# Altium schematic symbol library 724452_RPL-HX_Mobile_AEP_Rev0p91_Library.SchLib: 162 symbols (part 5 of 5) (continued)
## MEC152X_2
designator ?  (value not drawn)
Case/Package: *; Manufacturer Part Number: *
part A pins: A1 GPIO057_VCC_PWRGD_GPSPI_CLK_ALT, A2 XTAL1, A4 XTAL2, A7 GPIO062_RESETO_N_I2C11_SCL, A8 GPIO004_I2C00_SCL_UART2_DCD_N, A9 GPIO142_I2C05_SCL_UART2_CTS_N, A10 GPIO141_I2C05_SDA_UART2_RTS_N, B1 GPIO255_UART1_RX_ALT_UART1_DSR_N, B7 GPIO003_I2C00_SDA_UART2_RI_N, B8 GPIO143_I2C04_SDA_UART0_CTS_N, B9 GPIO150_I2C15_SCL_JTAG_TMS_UART2_DTR_N, B10 GPIO147_I2C15_SDA_JTAG_CLK_UART2_DSR_N, C1 VTR_PLL (power) hidden to VTR_PLL, C1 VTR_PLL, C7 GPIO144_I2C04_SCL_UART0_RTS_N, C8 GPIO146_I2C09_SCL_JTAG_TDO_UART2_TX, C12 GPIO060_KBRST_TST_CLK_OUT_UART1_DCD_N, D2 GPIO025_NEMI_INT_UART_CLK_UART1_RI_N, D12 GPIO155_I2C02_SCL_PS2_DAT1B, D13 GPIO154_I2C02_SDA_PS2_CLK1B, E1 GPIO035_PWM8_CTOUT1_ICT15, E3 NRESET_IN, E5 VBAT (power) hidden to VBAT, E5 VBAT, E8 GPIO145_I2C09_SDA_JTAG_TDI_UART2_RX, E12 GPIO007_I2C03_SDA_PS2_CLK0B, E13 GPIO010_I2C03_SCL_PS2_DAT0B, F1 GPIO244_UART_CLK_ALT_NEMI_INT_ALT_CMP_VIN1, F2 GPIO254_PWM1_ALT_CMP_VREF1, F5 VSS_ANALOG, F7 VTR1 (power) hidden to VTR1, F7 VTR1, F9 GPIO175_CMP_VOUT1_PWM8_ALT, F13 GPIO127_A20M_UART1_RTS_N, G1 VR_CAP (power) hidden to VR_CAP, G1 VR_CAP, G3 GPIO201_ADC01_TRACEDAT1, G5 VTR_REG (power) hidden to VTR_REG, G5 VTR_REG, G6 VSS2, G8 VSS1, H2 VREF_ADC (power) hidden to VREF_ADC, H2 VREF_ADC, H3 GPIO204_ADC04, H5 VSS_ADC, H6 VTR3 (power) hidden to VTR3, H6 VTR3, H7 VSS3, H8 VTR2 (power) hidden to VTR2, H8 VTR2, H12 GPIO105_UART0_RX_TFDP_DATA_TRACECLK, J1 GPIO200_ADC00_TRACEDAT0, J2 GPIO203_ADC03_TRACEDAT3, J3 GPIO061_ESPI_RESET_N_PWM7_ALT_NEC_SCI_ALT, J5 VTR_ANALOG (power) hidden to VTR_ANALOG, J5 VTR_ANALOG, J6 GPIO011_NSMI_ALT_PWM4_ICT7, J7 GPIO013_I2C07_SCL_SLV_SPI_IO3, J12 GPIO170_UART1_TX_CEC_OUT_JTAG_STRAP, J13 GPIO104_UART0_TX_TFDP_CLK_VTR2_STRAP, K1 GPIO202_ADC02_TRACEDAT2, K2 GPIO205_ADC05, K3 GPIO066_ESPI_CS_N_I2C13_SDA, K13 JTAG_RST_N, L2 GPIO206_ADC06, L3 GPIO065_ESPI_CLKI2C13_SCL_ICT5_ALT, L4 GPIO070_ESPI_IO0_I2C14_SDA, L5 GPIO073_ESPI_IO3_I2C01_SCL_ALT, L8 GPIO053_PWM0_SLV_SPI_MSTR_INT, M1 GPIO100_NEC_SCI_ALT2_ICT6, M2 GPIO207_ADC07_CMP_STRAP, M3 GPIO072_ESPI_IO2_I2C01_SDA_ALT, M4 GPIO063_ESPI_ALERT_N_PWM6_ALT_ICT8, M7 GPIO131_I2C01_SCL_SLV_SPI_CS_N, M8 GPIO014_PWM6_SLV_SPI_IO2_GPTP_IN2, M9 GPIO015_PWM7_ICT10, N2 GPIO012_I2C07_SDA_SLV_SPI_IO2, N3 GPIO071_ESPI_IO1_I2C14_SCL, N7 GPIO130_I2C01_SDA_SLV_SPI_IO0, N9 GPIO054_PWM1_SLV_SPI_SCLK
part B pins: A3 GPIO101_BGPO1, A5 GPIO024_GPSPI_CS_N_I2C07_SCL_ALT, A6 GPIO022_GPSPI_IO3, A11 GPIO241_PWM0_ALT_CMP_VOUT0, A12 GPIO153_LED2, A13 GPIO050_ICT0_TACH0, B2 GPIO221_32KHZ_OUT_SYS_SHDN_N, B3 GPIO102_BGPO2, B4 VCI_OVRD_IN_GPIO172, B5 GPIO253_BGPO0, B6 GPIO036, B11 GPIO171_UART1_RX_CEC_IN, B12 GPIO132_I2C06_SDA_KSO16, B13 GPIO157_LED1, C2 GPIO226, C3 SYSPWR_PRES_VCI_IN3_N_GPIO000_I2C11_SDA, C4 VCI_IN2_N_GPIO161, C5 VCI_IN1_N_GPIO162, C6 GPIO023_GPSPI_CLK, C9 GPIO245_GPSPI_IO0, C10 GPIO165_32KHZ_IN_CTOUT0, C11 GPIO243_GPSPI_IO1, C13 GPIO140_I2C06_SCL_ICT5_KSO17, D1 GPIO242_CMP_VIN0, D3 GPIO033_TACH3, D11 GPIO156_LED0, E2 GPIO246_CTOUT1_ALT_CMP_VREF0, E6 VCI_OUT_GPIO250, E7 GPIO240, E9 GPIO051_ICT1_TACH1, E11 GPIO125_PVT_CLK_KSO12, F3 GPIO106_PWROK, F6 VCI_IN0_N_GPIO163, F8 GPIO045_KSO01_PWM2_ALT_ICT14_CR_STRAP, F11 GPIO126_PVT_IO3_KSO13, F12 GPIO123_PVT_IO2_KSO10, G2 GPIO124_PVT_CS_N_KSO11_ICT12, G9 GPIO047_KSO03_PWM3_ALT_ICT13, G11 GPIO122_PVT_IO1_KSO09, G12 GPIO121_PVT_IO0_KSO08, G13 GPIO046_KSO02_ICT11, H1 GPIO067_VREF2_ADC, H9 GPIO043_SB-TSI_CLK, H11 GPIO044_VREF_VTT, H13 GPIO034_GPSPI_IO2, J8 GPIO222_PROCHOT_IN_N, J9 GPIO021_KSI2, J11 GPIO114_PS2_CLK0A_NEC_SCI, K11 GPIO107_NSMI_KSO04_I2C10_SCL, K12 GPIO042_PECI_DAT_SB-TSI_DAT, L1 GPIO152_KSO14_I2C07_SDA_ALT, L6 GPIO227_SHD_IO2_PWRGD_STRAP, L7 GPIO002_PWM5_SHD_CS1_N, L9 GPIO020_KSI1, L10 GPIO031_KSI6_GPTP_OUT1, L11 GPIO030_KSI5_I2C10_SDA, L12 GPIO112_KSO05, L13 GPIO115_PS2_DAT0A, M5 GPIO016_GPTP_IN1_SHD_IO3_ICT3_DSW_PWROK, M6 GPIO056_PWM3_SHD_CLK, M10 GPIO040_GPTP_OUT2_KSO00_UART1_CTS_N, M11 GPIO027_KSI4_UART0_DSR_N_I2C12_SCL, M12 GPIO120_KSO07_UART1_DTR_N, M13 GPIO113_KSO06_ICT9, N1 GPIO064_PCI_RESET_N, N4 GPIO224_GPTP_IN0_SHD_IO1, N5 GPIO223_SHD_IO0, N6 GPIO055_RSMRST_N_PWM2_SHD_CS0_N_BSS_STRAP, N8 GPIO052_ICT2_TACH2, N10 GPIO151_ICT4_KSO15, N11 GPIO017_KSI0_UART0_DCD_N, N12 GPIO032_KSI7_GPTP_OUT0_UART0_RI_N, N13 GPIO026_KSI3_UART0_DTR_N_I2C12_SDA
part A text: 1 OF 2
part B text: 2 OF 2

## MOSFET_N
designator ?, comment ?
CDS_LMAN_SYM_OUTLINE: -175,175,175,-175; OriginalSymbolOrigin: (-125,125); MATERIAL: ?; PACK_TYPE: ?; PART_NUMBER: ?
pins: 1 GATE (io), 2 SRC (io), 3 DRN (io)

## MOSFET_N#1
designator ?, comment ?
CDS_LMAN_SYM_OUTLINE: -100,100,100,-100; OriginalSymbolOrigin: (-75,75); MATERIAL: ?; PACK_TYPE: ?; PART_NUMBER: ?
pins: 1 GATE (io), 2 SRC (io), 3 DRN (io)

## MOSFET_N#2
designator ?, comment ?
CDS_LMAN_SYM_OUTLINE: -100,100,100,-100; OriginalSymbolOrigin: (-75,75); MATERIAL: ?; PACK_TYPE: ?; PART_NUMBER: ?
pins: 1 GATE (io), 2 SRC (io), 3 DRN (io)

## MOSFET_N_2
designator ?, comment ?
BOM_USE: STUFF; CDS_LMAN_SYM_OUTLINE: -200,200,200,-200; ROOM: NONE; OriginalSymbolOrigin: (-125,125); FP_TECH: ?; IP: ?; MATERIAL: ?; PACK_TYPE: ?; PART_NUMBER: ?; VARIANT: ?
pins: 1 GATE (io), 2 SRC (io), 3 DRN (io)

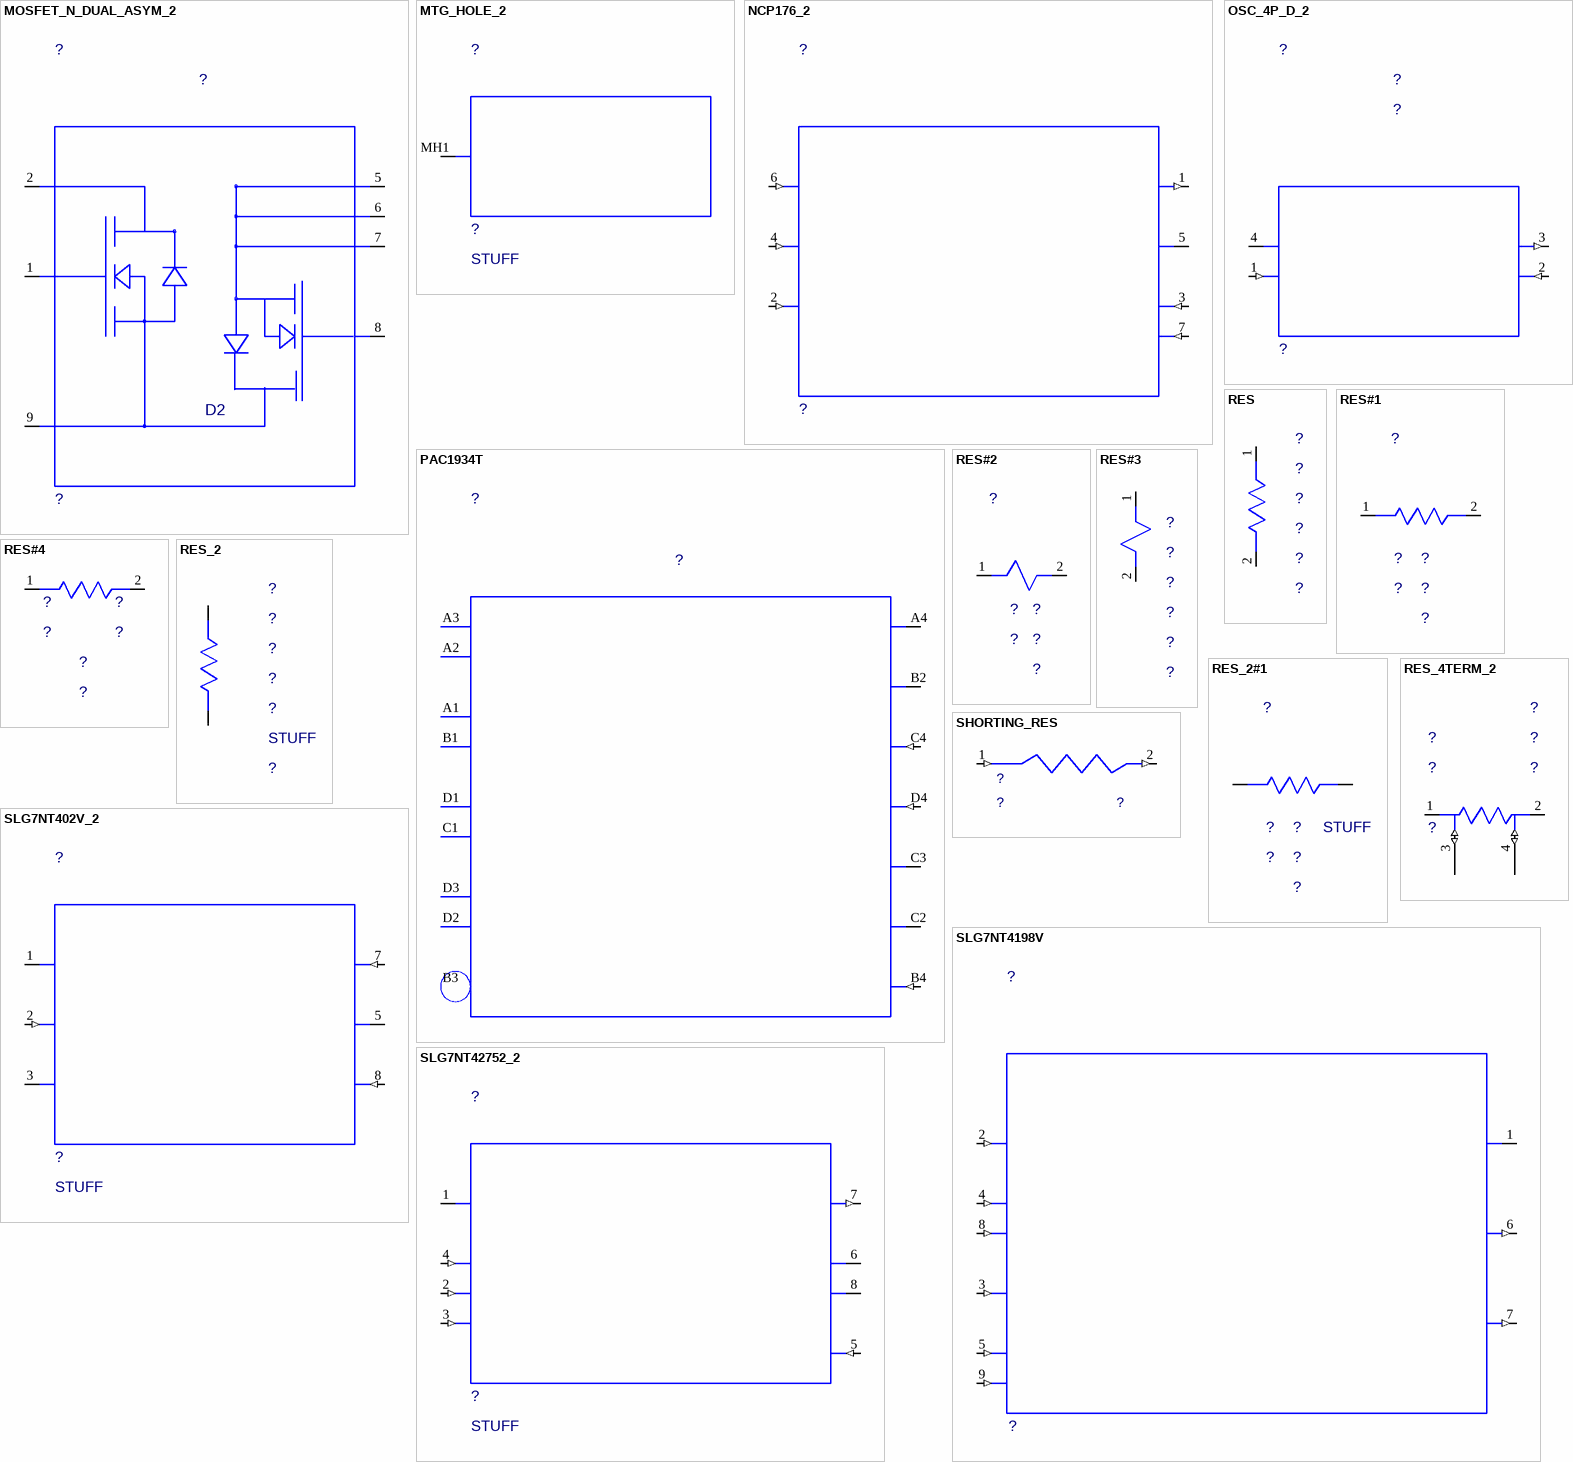
[diagram p41: symbols MOSFET_N_DUAL_ASYM_2 to SLG7NT42752_2]

## MOSFET_N_DUAL_ASYM_2
designator ?, comment ?
CDS_LMAN_SYM_OUTLINE: -250,300,250,-300; ROOM: NONE; OriginalSymbolOrigin: (-275,300); FP_TECH: ?; IP: ?; PACK_TYPE: ?; VARIANT: ?; MATERIAL: ?; PART_NUMBER: ?
pins: 1 G1 (io), 2 D1 (io), 5 S2_1 (io), 6 S2_2 (io), 7 S2_3 (io), 8 G2 (io), 9 S1_D2 (io)
text: D2

## MTG_HOLE_2
designator ?  BOM_USE: STUFF  (hidden comment: MTG_HOLE_2)
CDS_LMAN_SYM_OUTLINE: -200,100,200,-100; ROOM: NONE; OriginalSymbolOrigin: (-225,100); FP_TECH: ?; IP: ?; MATERIAL: ?; PACK_TYPE: ?; PART_NUMBER: ?; VARIANT: ?
pins: MH1 (io)

## NCP176_2
designator ?  (value not drawn)
CDS_LMAN_SYM_OUTLINE: -300,250,300,-200; ROOM: NONE; OriginalSymbolOrigin: (-325,250); FP_TECH: ?; IP: ?; MATERIAL: ?; PACK_TYPE: ?; PART_NUMBER: ?; VARIANT: ?
pins: 1 OUT (out), 2 FB (in), 3 GND (in), 4 EN (in), 5 NC (io), 6 IN (in), 7 GND_TPD (in)

## OSC_4P_D_2
designator ?, comment ?
BOM_USE: STUFF; CDS_LMAN_SYM_OUTLINE: -200,150,200,-100; ROOM: NONE; OriginalSymbolOrigin: (-225,150); FP_TECH: ?; IP: ?; MATERIAL: ?; PACK_TYPE: ?; PART_NUMBER: ?; TOLERANCE: ?; VARIANT: ?
pins: 1 E_D (in), 2 GND (in), 3 OUT (out), 4 VDD (power)

## PAC1934T
designator ?  (value not drawn)
CDS_LMAN_SYM_OUTLINE: -350,350,350,-350; OriginalSymbolOrigin: (-400,350); MATERIAL: ?; PACK_TYPE: ?; PART_NUMBER: ?
pins: A1 SENSE2_P (in), A2 SENSE1_N (in), A3 SENSE1_P (in), A4 VDD (power), B1 SENSE2_N (in), B2 VDD_IO (power), B3 PWRDN (in), B4 GND (in), C1 SENSE3_N (in), C2 ADDRSEL (io), C3 SLOW/ALERT_N (io), C4 SM_CLK (in), D1 SENSE3_P (in), D2 SENSE4_N (in), D3 SENSE4_P (in), D4 SM_DATA (in)

## RES
designator ?, comment ?
OriginalSymbolOrigin: (-25,75); MATERIAL: ?; PACK_TYPE: ?; PART_NUMBER: ?; TOLERANCE: ?; WATTAGE: ?
pins: 1 A (io), 2 B (io)

## RES#1
designator ?, comment ?
OriginalSymbolOrigin: (-75,25); MATERIAL: ?; PACK_TYPE: ?; PART_NUMBER: ?; TOLERANCE: ?; WATTAGE: ?
pins: 1 A (io), 2 B (io)

## RES#2
designator ?, comment ?
OriginalSymbolOrigin: (-75,50); MATERIAL: ?; PACK_TYPE: ?; PART_NUMBER: ?; TOLERANCE: ?; WATTAGE: ?
pins: 1 A (io), 2 B (io)

## RES#3
designator ?, comment ?
OriginalSymbolOrigin: (-25,75); MATERIAL: ?; PACK_TYPE: ?; PART_NUMBER: ?; TOLERANCE: ?; WATTAGE: ?
pins: 1 A (io), 2 B (io)

## RES#4
designator ?, comment ?
CDS_LMAN_SYM_OUTLINE: -50,25,50,-25; OriginalSymbolOrigin: (-75,25); FP_TECH: ?; IP: ?; MATERIAL: ?; PACK_TYPE: ?; PART_NUMBER: ?; TOLERANCE: ?; WATTAGE: ?
pins: 1 A (io), 2 B (io)

## RES_2
designator ?, comment ?  BOM_USE: STUFF
CDS_LMAN_SYM_OUTLINE: -50,50,50,-50; ROOM: NONE; OriginalSymbolOrigin: (-25,75); FP_TECH: ?; IP: ?; VARIANT: ?; MATERIAL: ?; PACK_TYPE: ?; PART_NUMBER: ?; TOLERANCE: ?; WATTAGE: ?
pins: 1 A (io), 2 B (io)

## RES_2#1
designator ?, comment ?  BOM_USE: STUFF
CDS_LMAN_SYM_OUTLINE: -50,50,50,-50; ROOM: NONE; OriginalSymbolOrigin: (-75,25); FP_TECH: ?; IP: ?; VARIANT: ?; MATERIAL: ?; PACK_TYPE: ?; PART_NUMBER: ?; TOLERANCE: ?; WATTAGE: ?
pins: 1 A (io), 2 B (io)

## RES_4TERM_2
designator ?, comment ?
CDS_LMAN_SYM_OUTLINE: -50,50,50,-50; ROOM: NONE; OriginalSymbolOrigin: (-75,25); FP_TECH: ?; IP: ?; VARIANT: ?; MATERIAL: ?; PACK_TYPE: ?; PART_NUMBER: ?; TOLERANCE: ?; WATTAGE: ?
pins: 1 PWRA (io), 2 PWRB (io), 3 SENA (io), 4 SENB (io)

## SHORTING_RES
designator ?, comment ?
CDS_LMAN_SYM_OUTLINE: -100,50,100,-50; OriginalSymbolOrigin: (-125,25); MATERIAL: ?; PACK_TYPE: ?
pins: 1 AGND (in), 2 GND (out)

## SLG7NT402V_2
designator ?  BOM_USE: STUFF  (hidden comment: SLG7NT402V_2)
CDS_LMAN_SYM_OUTLINE: -250,200,250,-200; ROOM: NONE; OriginalSymbolOrigin: (-275,200); FP_TECH: ?; IP: ?; PACK_TYPE: ?; VARIANT: ?; MATERIAL: ?; PART_NUMBER: ?
pins: 1 VDD (power), 2 ON (in), 3 D (io), 5 S (io), 7 CAP (in), 8 GND (in)

## SLG7NT4198V
designator ?  (value not drawn)
CDS_LMAN_SYM_OUTLINE: -400,300,400,-300; OriginalSymbolOrigin: (-425,300); PACK_TYPE: ?; MATERIAL: ?; PART_NUMBER: ?
pins: 1 VDD (power), 2 NMI_GATE (in), 3 MBL_PGD_MR_N (in), 4 SENSE (in), 5 GND (in), 6 SMC_INIT_CK (out), 7 SMC_RST_N (out), 8 EX_VREF (in), 9 GND_TPD (in)

## SLG7NT42752_2
designator ?  BOM_USE: STUFF  (hidden comment: SLG7NT42752_2)
CDS_LMAN_SYM_OUTLINE: -300,200,300,-200; ROOM: NONE; OriginalSymbolOrigin: (-325,200); FP_TECH: ?; IP: ?; PACK_TYPE: ?; VARIANT: ?; MATERIAL: ?; PART_NUMBER: ?
pins: 1 VDD (power), 2 IN_SCHMITT_TRIG (in), 3 DLY_SEL (in), 4 EN (in), 5 GND (in), 6 NC_6 (io), 7 OD_OUT (out), 8 NC_8 (io)

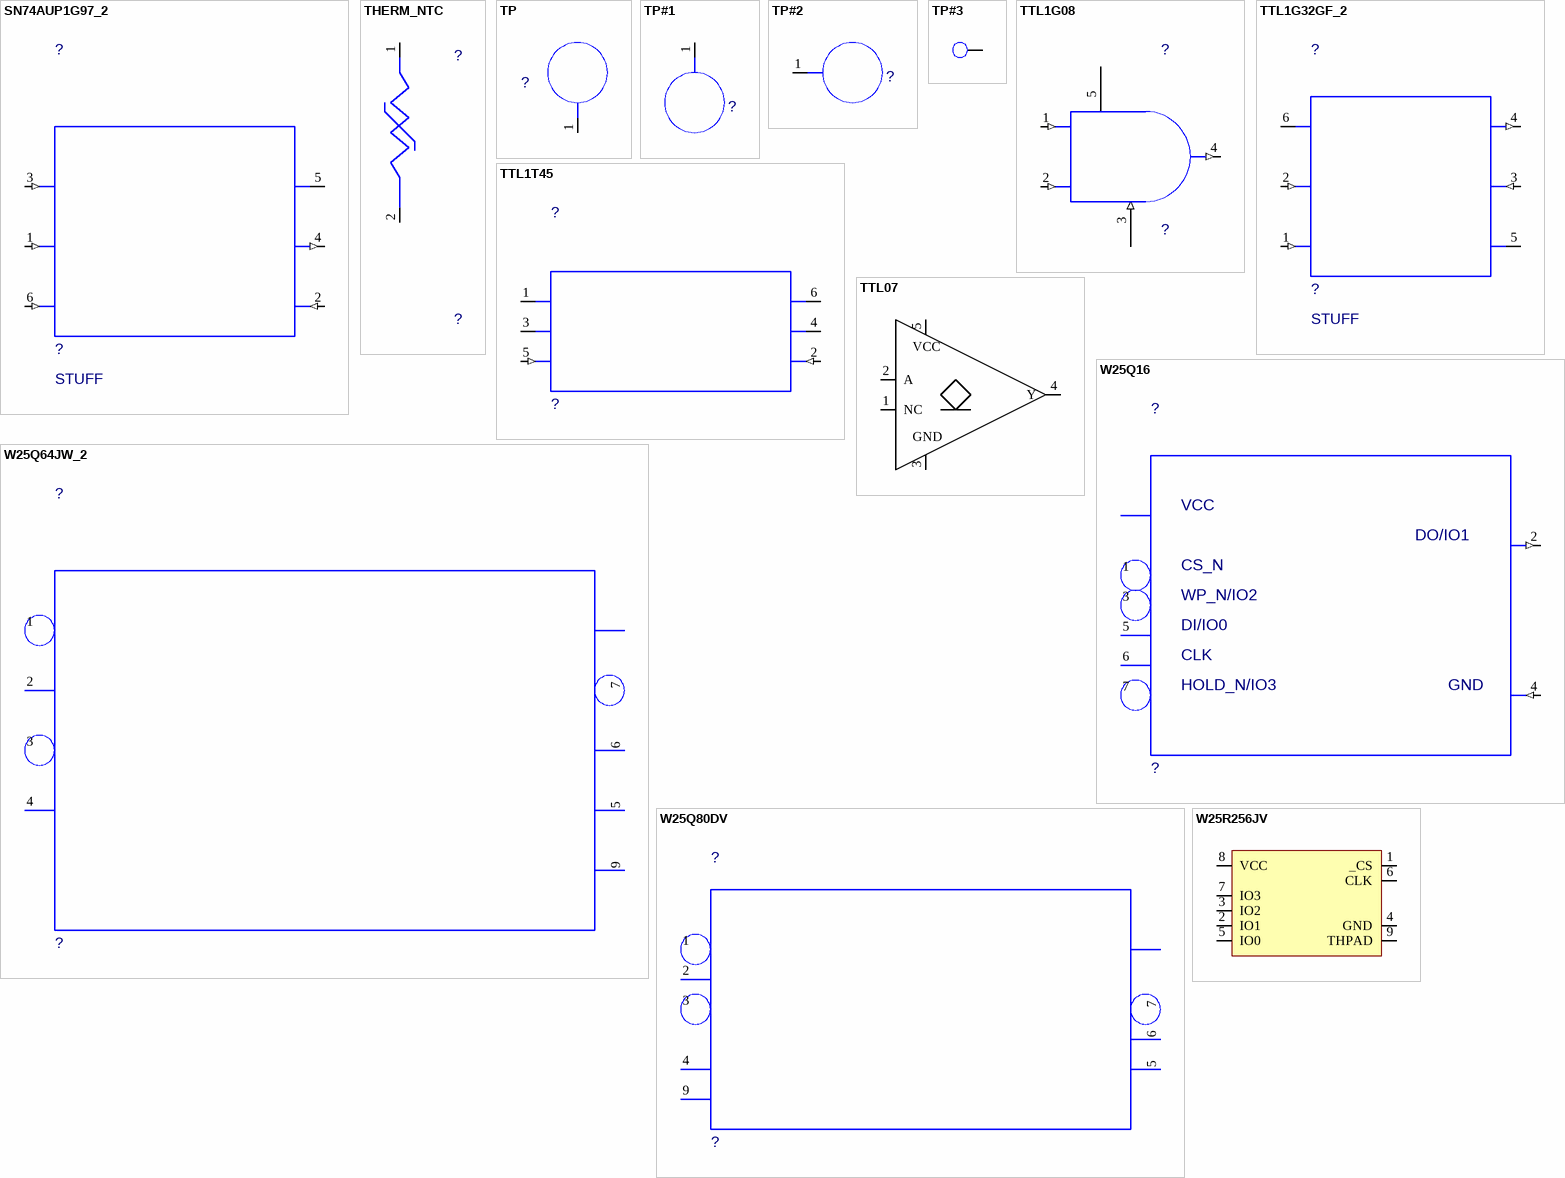
[diagram p42: symbols SN74AUP1G97_2 to W25R256JV]

## SN74AUP1G97_2
designator ?  BOM_USE: STUFF  (hidden comment: SN74AUP1G97_2)
CDS_LMAN_SYM_OUTLINE: -200,200,200,-150; ROOM: NONE; OriginalSymbolOrigin: (-225,200); FP_TECH: ?; IP: ?; PACK_TYPE: ?; VARIANT: ?; MATERIAL: ?; PART_NUMBER: ?
pins: 1 B (in), 2 GND (in), 3 A (in), 4 Y (out), 5 VCC (power), 6 C (in)

## THERM_NTC
designator ?, comment ?
CDS_LMAN_SYM_OUTLINE: -50,100,50,-100; OriginalSymbolOrigin: (-25,125); MATERIAL: ?; PACK_TYPE: ?; PART_NUMBER: ?; SIZE: 1B; TOLERANCE: ?
pins: 1 A[0] (io), 2 B[0] (io)

## TP
designator ?  (value not drawn)
CDS_LMAN_SYM_OUTLINE: -50,50,50,-50; OriginalSymbolOrigin: (-50,50); MATERIAL: ?; PART_NUMBER: ?; PACK_TYPE: ?
pins: 1 TP (io)

## TP#1
designator ?, comment TP  (value not drawn)
CDS_LMAN_SYM_OUTLINE: -50,50,50,-50; OriginalSymbolOrigin: (-50,75); MATERIAL: ?; PART_NUMBER: ?; PACK_TYPE: ?
pins: 1 TP (io)

## TP#2
designator ?, comment TP  (value not drawn)
CDS_LMAN_SYM_OUTLINE: -50,50,50,-50; OriginalSymbolOrigin: (-75,50); MATERIAL: ?; PACK_TYPE: ?; PART_NUMBER: ?
pins: 1 TP (io)

## TP#3
designator ?, comment TP  (value not drawn)
CDS_LMAN_SYM_OUTLINE: -100,50,100,-50; OriginalSymbolOrigin: (0,25); MATERIAL: ?; PACK_TYPE: ?; PART_NUMBER: ?
pins: 1 TP (io)

## TTL1G08
designator ?  (value not drawn)
CDS_LMAN_SYM_OUTLINE: -100,100,100,-100; OriginalSymbolOrigin: (-125,75); PACK_TYPE: ?; MATERIAL: ?; PART_NUMBER: ?
pins: 1 A (in), 2 B (in), 3 GND (in), 4 Y (out), 5 VCC (power)

## TTL1G32GF_2
designator ?  BOM_USE: STUFF  (hidden comment: TTL1G32GF_2)
CDS_LMAN_SYM_OUTLINE: -150,150,150,-150; ROOM: NONE; OriginalSymbolOrigin: (-175,150); FP_TECH: ?; IP: ?; PACK_TYPE: ?; VARIANT: ?; MATERIAL: ?; PART_NUMBER: ?
pins: 1 B (in), 2 A (in), 3 GND (in), 4 Y (out), 5 NC (io), 6 VCC (power)

## TTL1T45
designator ?  (value not drawn)
CDS_LMAN_SYM_OUTLINE: -200,100,200,-100; OriginalSymbolOrigin: (-225,100); PACK_TYPE: ?; MATERIAL: ?; PART_NUMBER: ?
pins: 1 VCCA (power), 2 GND (in), 3 A (io), 4 B (io), 5 DIR (in), 6 VCCB (power)

## TTL07
designator ?  (value not drawn)
CDS_LMAN_SYM_OUTLINE: -100,150,150,-150; OriginalSymbolOrigin: (-125,125); PACK_TYPE: ?
pins: 1 NC, 2 A, 3 GND, 4 Y, 5 9
text: VCC

## W25Q16
designator ?  (value not drawn)
OriginalSymbolOrigin: (-350,250); MATERIAL: ?; PACK_TYPE: ?; PART_NUMBER: ?
pins: 1 CS_N (in), 2 DO_IO1 (out), 3 WP_N_IO2 (io), 4 GND (in), 5 DI_IO0 (io), 6 CLK (in), 7 HOLD_N_IO3 (io), 8 VCC (power) hidden to VCC
text: DO/IO1; WP_N/IO2; DI/IO0; HOLD_N/IO3

## W25Q64JW_2
designator ?  (value not drawn)
CDS_LMAN_SYM_OUTLINE: -450,300,450,-300; ROOM: NONE; OriginalSymbolOrigin: (-500,300); FP_TECH: ?; IP: ?; PACK_TYPE: ?; VARIANT: ?; MATERIAL: ?; PART_NUMBER: ?
pins: 1 CS_N (in), 2 DO_IO1 (io), 3 WP_N_IO2 (io), 4 GND (in), 5 DI_IO0 (io), 6 CLK (in), 7 HOLD_N_RESET_N_IO3 (io), 8 VCC (power) hidden to VCC, 9 THPAD (in)

## W25Q80DV
designator ?  (value not drawn)
CDS_LMAN_SYM_OUTLINE: -350,200,350,-200; OriginalSymbolOrigin: (-400,200); MATERIAL: ?; PACK_TYPE: ?; PART_NUMBER: ?
pins: 1 CS_N (in), 2 DO_IO1 (io), 3 WP_IO2_N (io), 4 GND (in), 5 DI_IO0 (io), 6 CLK (out), 7 HOLD_IO3_N (io), 8 VCC (power) hidden to VCC, 9 THPAD (io)

## W25R256JV
designator ?  (value not drawn)
FLASH - NOR Memory IC 256Mb (32M x 8) SPI - Quad I/O 133 MHz 7 ns 8-WSON (8x6); Manufacturer Part Number: W25R256JVEIQ; Case/Package: 8-WSON
pins: 1 _CS, 2 IO1, 3 IO2, 4 GND, 5 IO0, 6 CLK, 7 IO3, 8 VCC, 9 THPAD

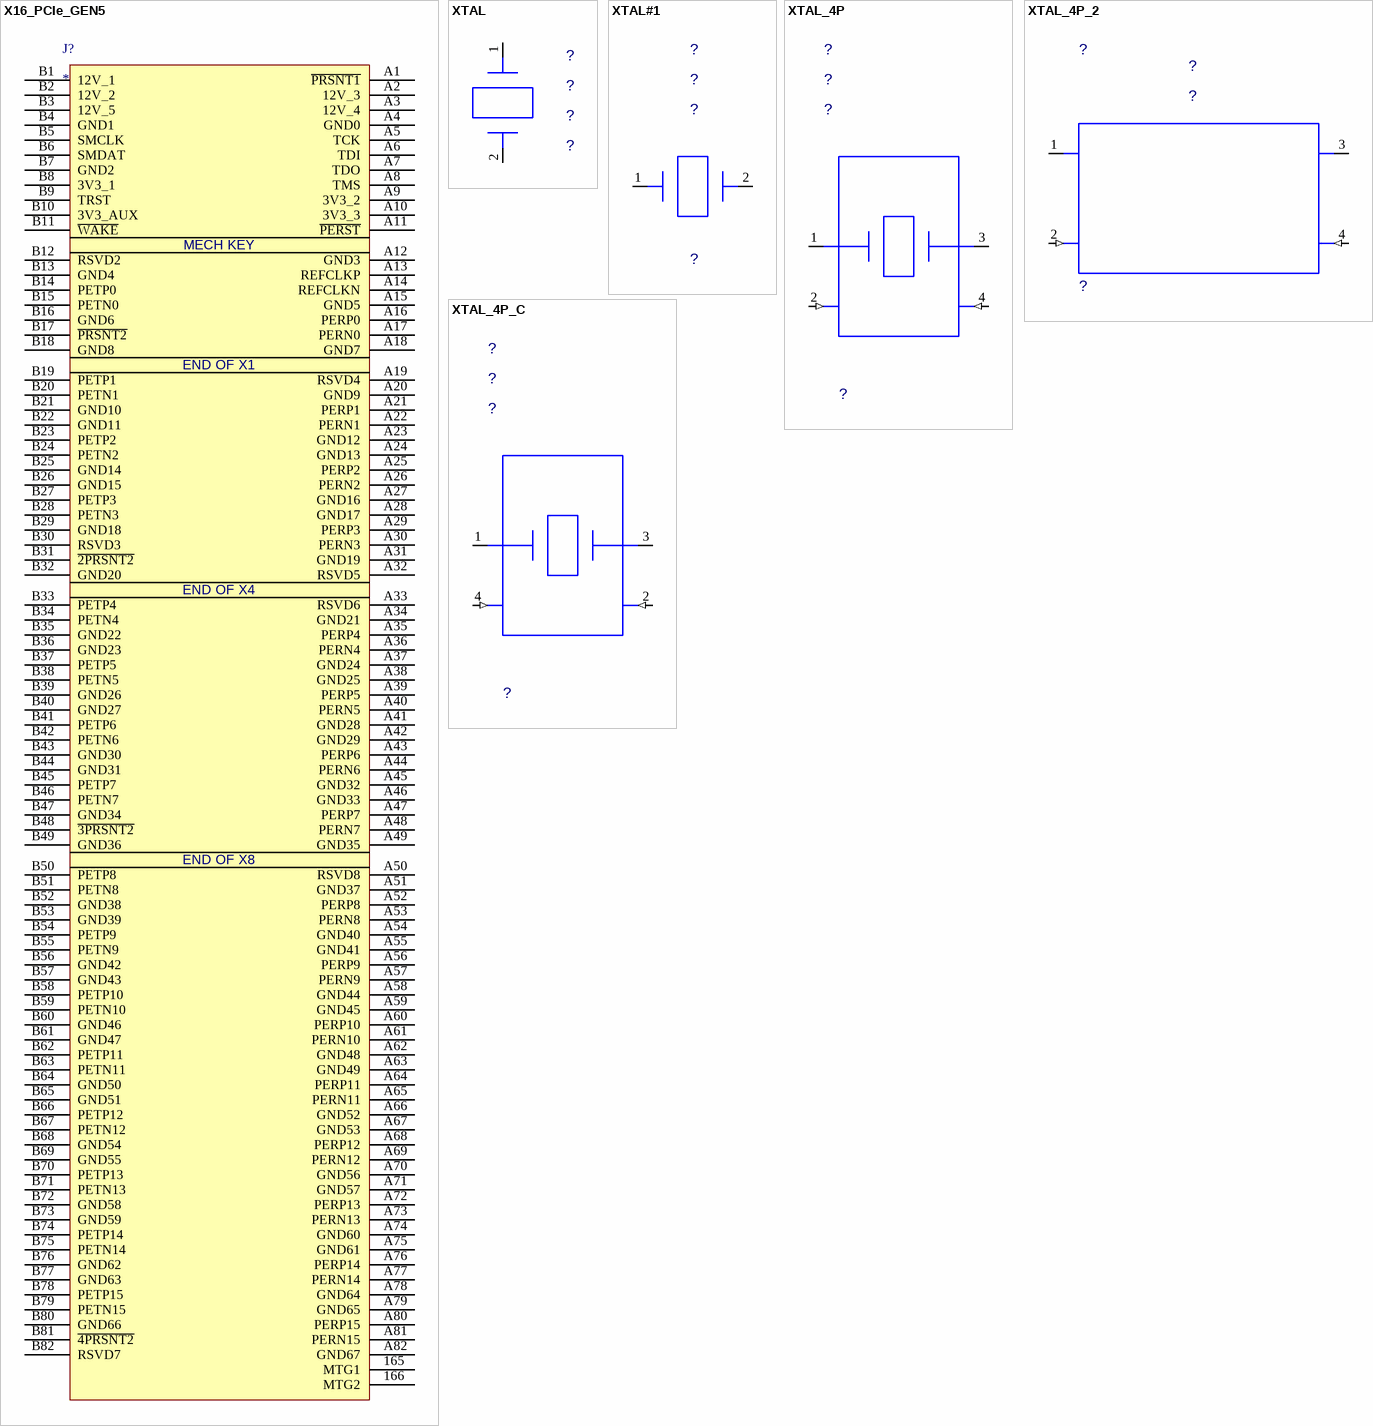
[diagram p43: symbols X16_PCIe_GEN5 to XTAL_4P_C]

## X16_PCIe_GEN5
designator J?
pins: 165 MTG1, 166 MTG2, A1 ~{PRSNT1}, A2 12V_3, A3 12V_4, A4 GND0, A5 TCK, A6 TDI, A7 TDO, A8 TMS, A9 3V3_2, A10 3V3_3, A11 ~{PERST}, A12 GND3, A13 REFCLKP, A14 REFCLKN, A15 GND5, A16 PERP0, A17 PERN0, A18 GND7, A19 RSVD4, A20 GND9, A21 PERP1, A22 PERN1, A23 GND12, A24 GND13, A25 PERP2, A26 PERN2, A27 GND16, A28 GND17, A29 PERP3, A30 PERN3, A31 GND19, A32 RSVD5, A33 RSVD6, A34 GND21, A35 PERP4, A36 PERN4, A37 GND24, A38 GND25, A39 PERP5, A40 PERN5, A41 GND28, A42 GND29, A43 PERP6, A44 PERN6, A45 GND32, A46 GND33, A47 PERP7, A48 PERN7, A49 GND35, A50 RSVD8, A51 GND37, A52 PERP8, A53 PERN8, A54 GND40, A55 GND41, A56 PERP9, A57 PERN9, A58 GND44, A59 GND45, A60 PERP10, A61 PERN10, A62 GND48, A63 GND49, A64 PERP11, A65 PERN11, A66 GND52, A67 GND53, A68 PERP12, A69 PERN12, A70 GND56, A71 GND57, A72 PERP13, A73 PERN13, A74 GND60, A75 GND61, A76 PERP14, A77 PERN14, A78 GND64, A79 GND65, A80 PERP15, A81 PERN15, A82 GND67, B1 12V_1, B2 12V_2, B3 12V_5, B4 GND1, B5 SMCLK, B6 SMDAT, B7 GND2, B8 3V3_1, B9 TRST, B10 3V3_AUX, B11 ~{WAKE}, B12 RSVD2, B13 GND4, B14 PETP0, B15 PETN0, B16 GND6, B17 ~{PRSNT2}, B18 GND8, B19 PETP1, B20 PETN1, B21 GND10, B22 GND11, B23 PETP2, B24 PETN2, B25 GND14, B26 GND15, B27 PETP3, B28 PETN3, B29 GND18, B30 RSVD3, B31 ~{2PRSNT2}, B32 GND20, B33 PETP4, B34 PETN4, B35 GND22, B36 GND23, B37 PETP5, B38 PETN5, B39 GND26, B40 GND27, B41 PETP6, B42 PETN6, B43 GND30, B44 GND31, B45 PETP7, B46 PETN7, B47 GND34, B48 ~{3PRSNT2}, B49 GND36, B50 PETP8, B51 PETN8, B52 GND38, B53 GND39, B54 PETP9, B55 PETN9, B56 GND42, B57 GND43, B58 PETP10, B59 PETN10, B60 GND46, B61 GND47, B62 PETP11, B63 PETN11, B64 GND50, B65 GND51, B66 PETP12, B67 PETN12, B68 GND54, B69 GND55, B70 PETP13, B71 PETN13, B72 GND58, B73 GND59, B74 PETP14, B75 PETN14, B76 GND62, B77 GND63, B78 PETP15, B79 PETN15, B80 GND66, B81 ~{4PRSNT2}, B82 RSVD7
text: MECH KEY; END OF X1; END OF X4; END OF X8

## XTAL
designator ?, comment ?
CDS_LMAN_SYM_OUTLINE: -50,50,50,-50; OriginalSymbolOrigin: (-50,75); PACK_TYPE: ?; MATERIAL: ?; PART_NUMBER: ?; TOLERANCE: ?
pins: 1 (io), 2 (io)

## XTAL#1
designator ?, comment ?
CDS_LMAN_SYM_OUTLINE: -50,50,50,-50; OriginalSymbolOrigin: (-75,50); MATERIAL: ?; PACK_TYPE: ?; PART_NUMBER: ?; TOLERANCE: ?
pins: 1 (io), 2 (io)

## XTAL_4P
designator ?, comment ?
CDS_LMAN_SYM_OUTLINE: -100,150,100,-150; OriginalSymbolOrigin: (-125,150); MATERIAL: ?; PACK_TYPE: ?; PART_NUMBER: ?; TOLERANCE: ?
pins: 1 A1 (io), 2 CASE1 (in), 3 B1 (io), 4 CASE2 (in)

## XTAL_4P_2
designator ?, comment ?
BOM_USE: STUFF; CDS_LMAN_SYM_OUTLINE: -200,100,200,-150; ROOM: NONE; OriginalSymbolOrigin: (-225,100); FP_TECH: ?; IP: ?; MATERIAL: ?; PACK_TYPE: ?; PART_NUMBER: ?; TOLERANCE: ?; VARIANT: ?
pins: 1 XTAL1 (io), 2 GND1 (in), 3 XTAL2 (io), 4 GND2 (in)

## XTAL_4P_C
designator ?, comment ?
CDS_LMAN_SYM_OUTLINE: -100,150,100,-150; OriginalSymbolOrigin: (-125,150); MATERIAL: ?; PACK_TYPE: ?; PART_NUMBER: ?; TOLERANCE: ?
pins: 1 A1 (io), 2 GND2 (in), 3 A2 (io), 4 GND1 (in)